# Altium footprint library Chickenfood.PcbLib: 40 footprints (part 1 of 3)
Each footprint in its own frame and in the unit in brackets; x right, y up, seen from the top. Pads: shape width x height; smd on the part's side, far side on the other; paste and mask are expansions set on the pad; w line width, h text height; cw(c..) or ccw(c..) is an arc to the next point about the centre after c.
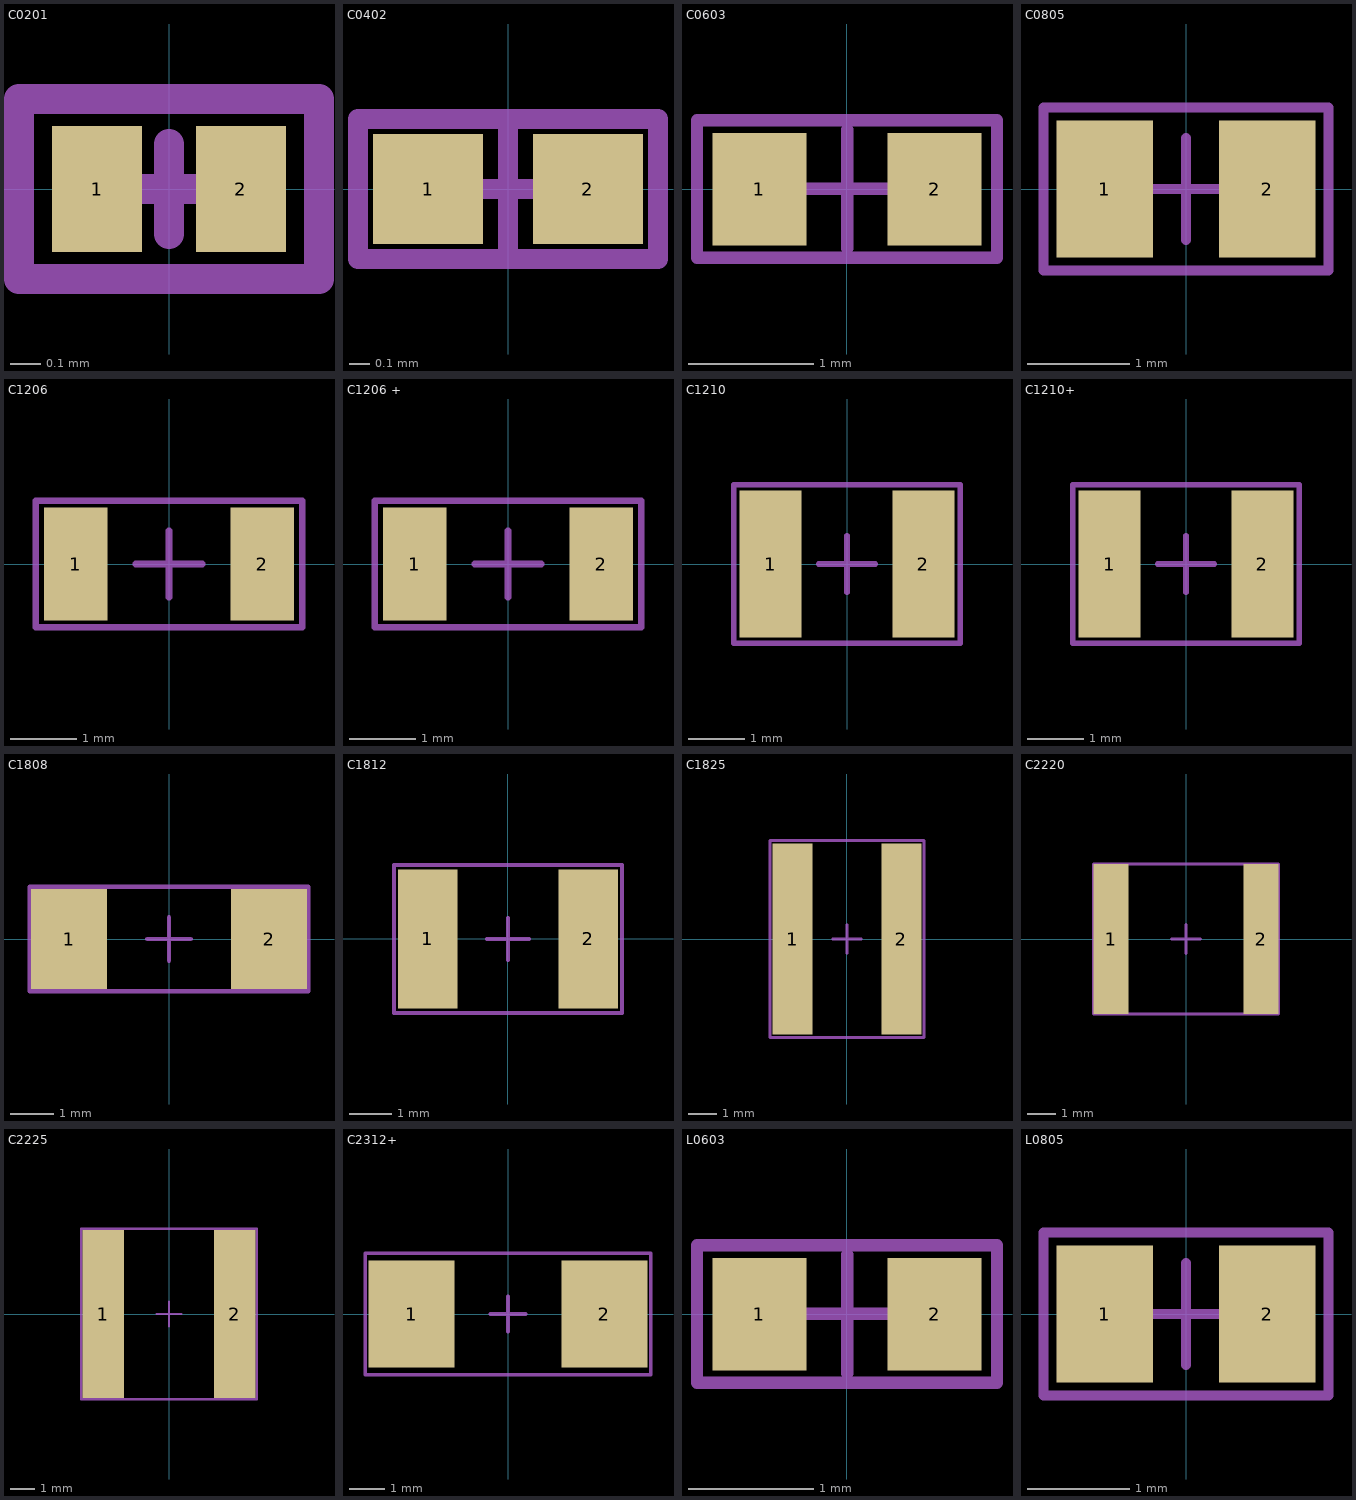
[diagram p0: the footprints below, top view; thin cyan lines are the x and y axes]

## C0201 [mm] "Chip Capacitor; Body 1.0x0.5mm (LxW typ), IPC High Density"
height 0.6
pads (2):
  rect 0.3x0.42 smd: 1(-0.24,0) 2(0.24,0)
Top Courtyard:
  lines w0.1: -0.5,-0.3 0.5,-0.3 0.5,0.3 -0.5,0.3 -0.5,-0.3
Top Designator:
  text ".Designator" at -0.451,-0.045 h0.2
Top Component Center (Mech17):
  lines w0.1: -0.15,0 0.15,0 ; 0,-0.15 0,0.15
3D body "C0201.STEP": height 0.3, standoff 0, extent -0.3,-0.15 0.3,0.15

## C0402 [mm] "Chip Capacitor; Body 1.0x0.5mm (LxW typ), IPC High Density"
height 0.6
pads (2):
  rect 0.55x0.55 smd: 1(-0.4,0) 2(0.4,0)
Top Courtyard:
  lines w0.1: -0.75,-0.35 0.75,-0.35 0.75,0.35 -0.75,0.35 -0.75,-0.35
Top Designator:
  text ".Designator" at -0.564,-0.057 h0.25
Top Component Center (Mech17):
  lines w0.1: -0.3,0 0.3,0 ; 0,-0.3 0,0.3
3D body "C0402.STEP": height 0.5, standoff 0, extent -0.5,-0.25 0.5,0.25

## C0603 [mm] "Chip Capacitor; Body 1.6x0.8mm (LxW typ), IPC High Density"
height 0.85
pads (2):
  rect 0.75x0.9 smd: 1(-0.7,0) 2(0.7,0)
Top Courtyard:
  lines w0.1: -1.2,-0.55 -1.2,0.55 1.2,0.55 1.2,-0.55 -1.2,-0.55
Top Designator:
  text ".Designator" at -1.126,-0.113 h0.5
Top Component Center (Mech17):
  lines w0.1: -0.475,0 0.475,0 ; 0,-0.475 0,0.475
3D body "C0603.STEP": height 0.8, standoff 0, extent -0.8,-0.4 0.8,0.4

## C0805 [mm] "Chip Capacitor; Body 2.0x1.3mm (LxW typ), IPC High Density"
height 1.1
pads (2):
  rect 0.95x1.35 smd: 1(-0.8,0) 2(0.8,0)
Top Courtyard:
  lines w0.1: -1.4,-0.8 -1.4,0.8 1.4,0.8 1.4,-0.8 -1.4,-0.8
Top Designator:
  text ".Designator" at -1.346,-0.135 h0.6
Top Component Center (Mech17):
  lines w0.1: -0.5,0 0.5,0 ; 0,-0.5 0,0.5
3D body "C0805.STEP": height 0.6, standoff 0, extent -1,-0.625 1,0.625

## C1206 [mm] "Chip Capacitor; Body 3.2x1.6mm (LxW typ), IPC High Density"
height 1.35
pads (2):
  rect 0.95x1.7 smd: 1(-1.4,0) 2(1.4,0)
Top Courtyard:
  lines w0.1: -2,-0.95 2,-0.95 2,0.95 -2,0.95 -2,-0.95
Top Designator:
  text ".Designator" at -1.909,-0.192 h0.85
Top Component Center (Mech17):
  lines w0.1: -0.5,0 0.5,0 ; 0,-0.5 0,0.5
3D body "C1206.STEP": height 0.78, standoff 0, extent -1.6,-0.8 1.6,0.8

## C1206 + [mm] "Chip Capacitor; Body 3.2x1.6mm (LxW typ), IPC High Density"
height 1.35
pads (2):
  rect 0.95x1.7 smd: 1(-1.4,0) 2(1.4,0)
Top Courtyard:
  lines w0.1: -2,-0.95 2,-0.95 2,0.95 -2,0.95 -2,-0.95
Top Designator:
  text ".Designator" at -1.909,-0.192 h0.85
Top Component Center (Mech17):
  lines w0.1: -0.5,0 0.5,0 ; 0,-0.5 0,0.5
3D body "C1206+.STEP": height 1.71, standoff 0, extent -1.7,-0.84 1.7,0.84

## C1210 [mm] "Chip Capacitor; Body 3.2x2.5mm (LxW typ), IPC High Density"
height 1.35
pads (2):
  rect 1.1x2.6 smd: 1(-1.35,0) 2(1.35,0)
Top Courtyard:
  lines w0.1: -2,-1.4 2,-1.4 2,1.4 -2,1.4 -2,-1.4
Top Designator:
  text ".Designator" at -2.026,-0.204 h0.9
Top Component Center (Mech17):
  lines w0.1: -0.5,0 0.5,0 ; 0,-0.5 0,0.5
3D body "C1210.STEP": height 0.78, standoff 0, extent -1.6,-1.25 1.6,1.25

## C1210+ [mm] "Chip Capacitor; Body 3.2x2.5mm (LxW typ), IPC High Density"
height 1.35
pads (2):
  rect 1.1x2.6 smd: 1(-1.35,0) 2(1.35,0)
Top Courtyard:
  lines w0.1: -2,-1.4 2,-1.4 2,1.4 -2,1.4 -2,-1.4
Top Designator:
  text ".Designator" at -2.026,-0.204 h0.9
Top Component Center (Mech17):
  lines w0.1: -0.5,0 0.5,0 ; 0,-0.5 0,0.5
3D body "C1210+.STEP": height 2.03, standoff 0, extent -1.85,-1.465 1.85,1.465

## C1808 [mm] "Chip Capacitor; Body 4.7x2.0mm (LxW typ), IPC High Density"
pads (2):
  rect 1.75x2.3 smd: 1(-2.3,0) 2(2.3,0)
Top Courtyard:
  lines w0.1: -3.2,-1.2 -3.2,1.2 3.2,1.2 3.2,-1.2 -3.2,-1.2
Top Designator:
  text ".Designator" at -2.926,-0.294 h1.3
Top Component Center (Mech17):
  lines w0.1: -0.5,0 0.5,0 ; 0,-0.5 0,0.5
3D body "C1808.STEP": height 0.9, standoff 0, extent -2.25,-1 2.25,1

## C1812 [mm] "Chip Capacitor; Body 4.5x3.2mm (LxW typ), IPC High Density"
height 1.35
pads (2):
  rect 1.4x3.3 smd: 1(-1.9,0) 2(1.9,0)
Top Courtyard:
  lines w0.1: -2.7,-1.75 2.7,-1.75 2.7,1.75 -2.7,1.75 -2.7,-1.75
Top Designator:
  text ".Designator" at -2.699,-0.272 h1.2
Top Component Center (Mech17):
  lines w0.1: -0.5,0 0.5,0 ; 0,-0.5 0,0.5
3D body "C1812.STEP": height 1, standoff 0, extent -2.25,-1.6 2.25,1.6

## C1825 [mm] "Chip Capacitor; Body 4.5x6.4mm (LxW typ), IPC High Density"
height 1.1
pads (2):
  rect 1.4x6.7 smd: 1(-1.9,0) 2(1.9,0)
Top Courtyard:
  lines w0.1: -2.7,-3.45 2.7,-3.45 2.7,3.45 -2.7,3.45 -2.7,-3.45
Top Designator:
  text ".Designator" at 0.345,-3.434 h1.52
Top Component Center (Mech17):
  lines w0.1: -0.5,0 0.5,0 ; 0,-0.5 0,0.5
3D body "C1825.SLDPRT": height 1.15, standoff 0, extent -2.25,-3.2 2.25,3.2

## C2220 [mm] "Chip Capacitor; Body 5.7x5.0(LxW typ), IPC High Density"
height 2.5
pads (2):
  rect 1.2x5.2 smd: 1(-2.6,0) 2(2.6,0)
Top Courtyard:
  lines w0.1: -3.2,-2.6 3.2,-2.6 3.2,2.6 -3.2,2.6 -3.2,-2.6
Top Designator:
  text ".Designator" at -3.152,-0.317 h1.4
Top Component Center (Mech17):
  lines w0.1: -0.5,0 0.5,0 ; 0,-0.5 0,0.5
3D body "C2220.STEP": height 1, standoff 0, extent -2.8,-2.5 2.8,2.5

## C2225 [mm] "Chip Capacitor; Body 5.6x6.4(LxW typ), IPC High Density"
pads (2):
  rect 1.7x6.9 smd: 1(-2.7,0) 2(2.7,0)
Top Courtyard:
  lines w0.1: -3.6,-3.5 3.6,-3.5 3.6,3.5 -3.6,3.5 -3.6,-3.5
Top Designator:
  text ".Designator" at 0.34,-3.379 h1.5
Top Component Center (Mech17):
  lines w0.1: -0.5,0 0.5,0 ; 0,-0.5 0,0.5
3D body "C2225.STEP": height 1, standoff 0, extent -2.8,-3.15 2.8,3.15

## C2312+ [mm] "Chip Capacitor; Body 5.6x6.4(LxW typ), IPC High Density"
pads (2):
  rect 2.4x3 smd: 1(-2.7,0) 2(2.7,0)
Top Courtyard:
  lines w0.1: -4,-1.7 -4,1.7 4,1.7 4,-1.7 -4,-1.7
Top Designator:
  text ".Designator" at -3.379,-0.34 h1.5
Top Component Center (Mech17):
  lines w0.1: -0.5,0 0.5,0 ; 0,-0.5 0,0.5
3D body "C2312+.STEP": height 2.7, standoff 0, extent -3.05,-1.675 3.05,1.675

## L0603 [mm]
height 0.85
pads (2):
  rect 0.75x0.9 smd: 1(-0.7,0) 2(0.7,0)
Top Courtyard:
  lines w0.1: -1.2,-0.55 -1.2,0.55 1.2,0.55 1.2,-0.55 -1.2,-0.55
Top Designator:
  text ".Designator" at -1.126,-0.113 h0.5
Top Component Center (Mech17):
  lines w0.1: -0.475,0 0.475,0 ; 0,-0.475 0,0.475
3D body "L0603.STEP": height 0.45, standoff 0, extent -0.8,-0.4 0.8,0.4

## L0805 [mm]
height 1.1
pads (2):
  rect 0.95x1.35 smd: 1(-0.8,0) 2(0.8,0)
Top Courtyard:
  lines w0.1: -1.4,-0.8 1.4,-0.8 1.4,0.8 -1.4,0.8 -1.4,-0.8
Top Designator:
  text ".Designator" at -1.346,-0.135 h0.6
Top Component Center (Mech17):
  lines w0.1: -0.5,0 0.5,0 ; 0,-0.5 0,0.5
3D body "L0805.STEP": height 0.6, standoff 0, extent -1,-0.625 1,0.625